# Altium footprint library Minh_Lib.PcbLib: 141 footprints (part 3 of 9)
Each footprint in its own frame and in the unit in brackets; x right, y up, seen from the top. Pads: shape width x height; smd on the part's side, far side on the other; paste and mask are expansions set on the pad; w line width, h text height; cw(c..) or ccw(c..) is an arc to the next point about the centre after c.
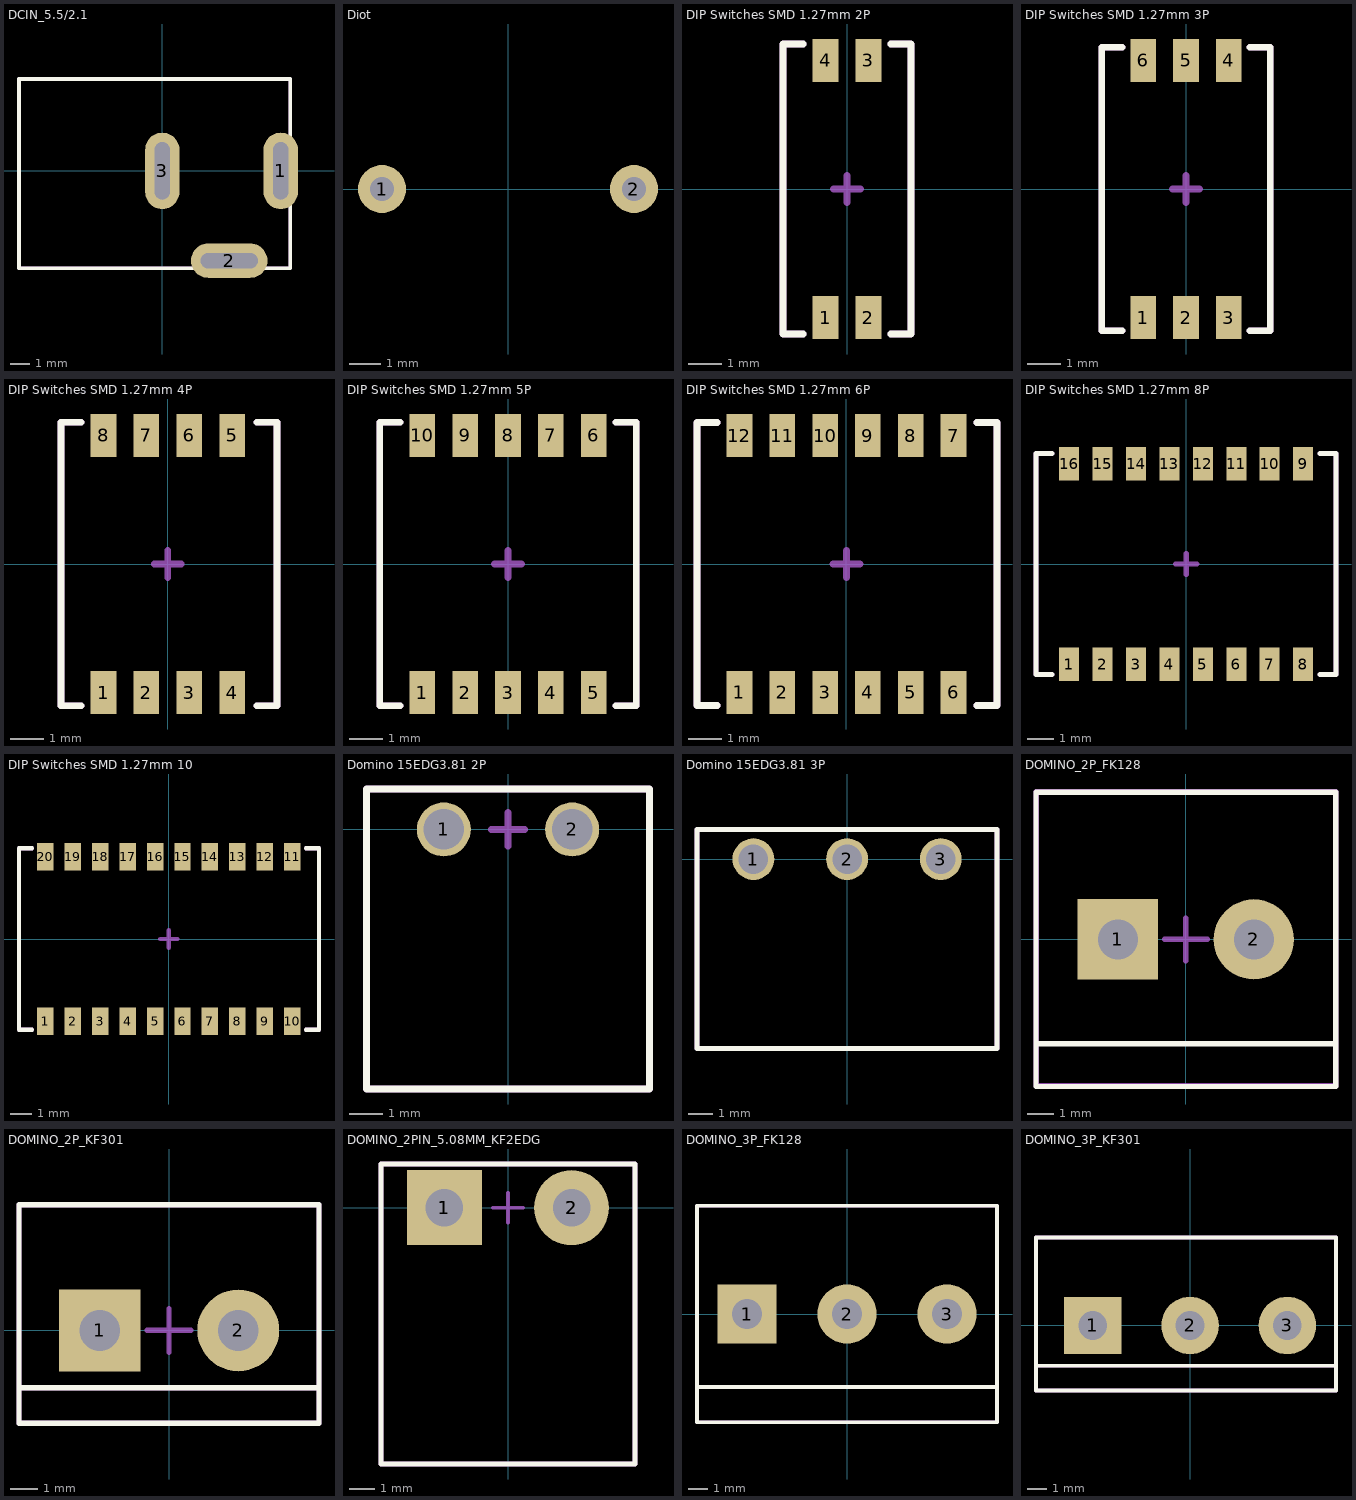
[diagram p2: the footprints below, top view; thin cyan lines are the x and y axes]

## DCIN_5.5/2.1 [mm] "DCInput _ 5.5/2.1"
pads (3):
  oval 1.8x4 hole 0.8 slot 3 at 90 deg: 1(6.2,0) 3(0,0)
  oval 4x1.8 hole 0.8 slot 3 at 0 deg: 2(3.5,-4.7)
Top Overlay:
  lines w0.2: -7.5,-5.1 6.7,-5.1 6.7,4.8 -7.5,4.8 -7.5,-5.1
Mechanical 13:
  lines w0.2: -7.5,-5.1 6.7,-5.1 6.7,4.8 -7.5,4.8 -7.5,-5.1
  text "+" at 7.5,-0.6 h1.2
  text "'.Designator'" at -7.3,-1 h1.2
Mechanical 15:
  lines w0.2: -0.6,0 0,0 ; 0,-0.6 0,0 ; 0,0.6 0,0 ; 0.6,0 0,0
3D body "User Library-dc range - dc connector[4840_2201].step": height 11.01, standoff -3.49, extent -7.303,-4.905 6.524,4.6

## Diot [mil]
pads (2):
  round 60 hole 30: 1(-157.48,0) 2(157.48,0)

## DIP Switches SMD 1.27mm 2P [mm] "Wurth Elektronik - 416131160802"
pads (4):
  rect 0.76x1.27 smd: 1(-0.635,-3.81) 2(0.635,-3.81) 3(0.635,3.81) 4(-0.635,3.81)
Top Overlay:
  lines w0.2: -1.3,-4.3 -1.9,-4.3 -1.9,4.3 -1.3,4.3 ; 1.3,-4.3 1.9,-4.3 1.9,4.3 1.3,4.3
Mechanical 13:
  lines w0.2: -1.3,-4.3 -1.9,-4.3 -1.9,4.3 -1.3,4.3 ; 1.3,-4.3 1.9,-4.3 1.9,4.3 1.3,4.3
  text "'.Designator'" at -1.7,-2.7 h1
Mechanical 15:
  lines w0.2: -0.4,0 0,0 ; 0,-0.4 0,0 ; 0,0.4 0,0 ; 0.4,0 0,0
3D body "User Library-416131160802.step": height 2.6, standoff 0, extent -1.855,-4.22 1.855,4.22

## DIP Switches SMD 1.27mm 3P [mm] "Wurth Elektronik - 416131160803"
pads (6):
  rect 0.76x1.27 smd: 1(-1.27,-3.81) 2(0,-3.81) 3(1.27,-3.81) 4(1.27,3.81) 5(0,3.81) 6(-1.27,3.81)
Top Overlay:
  lines w0.2: -1.9,-4.2 -2.5,-4.2 -2.5,4.2 -1.9,4.2 ; 1.9,-4.2 2.5,-4.2 2.5,4.2 1.9,4.2
Mechanical 13:
  lines w0.2: -1.9,-4.2 -2.5,-4.2 -2.5,4.2 -1.9,4.2 ; 1.9,-4.2 2.5,-4.2 2.5,4.2 1.9,4.2
  text "'.Designator'" at -1.9,-2.7 h1
Mechanical 15:
  lines w0.2: -0.4,0 0,0 ; 0,-0.4 0,0 ; 0,0.4 0,0 ; 0.4,0 0,0
3D body "User Library-416131160803.step": height 2.6, standoff 0, extent -2.49,-4.22 2.49,4.22

## DIP Switches SMD 1.27mm 4P [mm] "Wurth Elektronik - 416131160804"
pads (8):
  rect 0.76x1.27 smd: 1(-1.905,-3.81) 2(-0.635,-3.81) 3(0.635,-3.81) 4(1.905,-3.81) 5(1.905,3.81) 6(0.635,3.81) 7(-0.635,3.81) 8(-1.905,3.81)
Top Overlay:
  lines w0.2: -2.565,-4.2 -3.165,-4.2 -3.165,4.2 -2.565,4.2 ; 2.635,-4.2 3.235,-4.2 3.235,4.2 2.635,4.2
Mechanical 13:
  lines w0.2: -2.565,-4.2 -3.165,-4.2 -3.165,4.2 -2.565,4.2 ; 2.635,-4.2 3.235,-4.2 3.235,4.2 2.635,4.2
  text "'.Designator'" at -2.54,-2.54 h1
Mechanical 15:
  lines w0.2: -0.4,0 0,0 ; 0,-0.4 0,0 ; 0,0.4 0,0 ; 0.4,0 0,0
3D body "User Library-416131160804.step": height 2.6, standoff 0, extent -3.125,-4.22 3.125,4.22

## DIP Switches SMD 1.27mm 5P [mm] "Wurth Elektronik - 416131160805"
pads (10):
  rect 0.76x1.27 smd: 1(-2.54,-3.81) 2(-1.27,-3.81) 3(0,-3.81) 4(1.27,-3.81) 5(2.54,-3.81) 6(2.54,3.81) 7(1.27,3.81) 8(0,3.81) 9(-1.27,3.81) 10(-2.54,3.81)
Top Overlay:
  lines w0.2: -3.2,-4.2 -3.8,-4.2 -3.8,4.2 -3.2,4.2 ; 3.2,-4.2 3.8,-4.2 3.8,4.2 3.2,4.2
Mechanical 13:
  lines w0.2: -3.2,-4.2 -3.8,-4.2 -3.8,4.2 -3.2,4.2 ; 3.2,-4.2 3.8,-4.2 3.8,4.2 3.2,4.2
  text "'.Designator'" at -3,-3 h1
Mechanical 15:
  lines w0.2: -0.4,0 0,0 ; 0,-0.4 0,0 ; 0,0.4 0,0 ; 0.4,0 0,0
3D body "User Library-416131160805.step": height 2.6, standoff 0, extent -3.76,-4.22 3.76,4.22

## DIP Switches SMD 1.27mm 6P [mm] "Wurth Elektronik - 416131160806"
pads (12):
  rect 0.76x1.27 smd: 1(-3.175,-3.81) 2(-1.905,-3.81) 3(-0.635,-3.81) 4(0.635,-3.81) 5(1.905,-3.81) 6(3.175,-3.81) 7(3.175,3.81) 8(1.905,3.81) 9(0.635,3.81) 10(-0.635,3.81) 11(-1.905,3.81) 12(-3.175,3.81)
Top Overlay:
  lines w0.2: -3.835,-4.2 -4.435,-4.2 -4.435,4.2 -3.835,4.2 ; 3.865,-4.2 4.465,-4.2 4.465,4.2 3.865,4.2
Mechanical 13:
  lines w0.2: -3.835,-4.2 -4.435,-4.2 -4.435,4.2 -3.835,4.2 ; 3.865,-4.2 4.465,-4.2 4.465,4.2 3.865,4.2
  text "'.Designator'" at -3.81,-2.54 h1
Mechanical 15:
  lines w0.2: -0.4,0 0,0 ; 0,-0.4 0,0 ; 0,0.4 0,0 ; 0.4,0 0,0
3D body "User Library-416131160806.step": height 2.6, standoff 0, extent -4.395,-4.22 4.395,4.22

## DIP Switches SMD 1.27mm 8P [mm] "Wurth Elektronik - 416131160808"
pads (16):
  rect 0.76x1.27 smd: 1(-4.445,-3.81) 2(-3.175,-3.81) 3(-1.905,-3.81) 4(-0.635,-3.81) 5(0.635,-3.81) 6(1.905,-3.81) 7(3.175,-3.81) 8(4.445,-3.81) 9(4.445,3.81) 10(3.175,3.81) 11(1.905,3.81) 12(0.635,3.81) 13(-0.635,3.81) 14(-1.905,3.81) 15(-3.175,3.81) 16(-4.445,3.81)
Top Overlay:
  lines w0.2: -5.105,-4.2 -5.705,-4.2 -5.705,4.2 -5.105,4.2 ; 5.095,-4.2 5.695,-4.2 5.695,4.2 5.095,4.2
Mechanical 13:
  lines w0.2: -5.105,-4.2 -5.705,-4.2 -5.705,4.2 -5.105,4.2 ; 5.095,-4.2 5.695,-4.2 5.695,4.2 5.095,4.2
  text "'.Designator'" at -4.445,-3.175 h1
Mechanical 15:
  lines w0.2: -0.4,0 0,0 ; 0,-0.4 0,0 ; 0,0.4 0,0 ; 0.4,0 0,0
3D body "User Library-416131160808.step": height 2.6, standoff 0, extent -5.615,-4.22 5.715,4.22

## DIP Switches SMD 1.27mm 10 [mm] "Wurth Elektronik - 416131160810"
pads (20):
  rect 0.76x1.27 smd: 1(-5.715,-3.81) 2(-4.445,-3.81) 3(-3.175,-3.81) 4(-1.905,-3.81) 5(-0.635,-3.81) 6(0.635,-3.81) 7(1.905,-3.81) 8(3.175,-3.81) 9(4.445,-3.81) 10(5.715,-3.81) 11(5.715,3.81) 12(4.445,3.81) 13(3.175,3.81) 14(1.905,3.81) 15(0.635,3.81) 16(-0.635,3.81) 17(-1.905,3.81) 18(-3.175,3.81) 19(-4.445,3.81) 20(-5.715,3.81)
Top Overlay:
  lines w0.2: -6.34,-4.2 -6.94,-4.2 -6.94,4.2 -6.34,4.2 ; 6.36,-4.2 6.96,-4.2 6.96,4.2 6.36,4.2
Mechanical 13:
  lines w0.2: -6.34,-4.2 -6.94,-4.2 -6.94,4.2 -6.34,4.2 ; 6.36,-4.2 6.96,-4.2 6.96,4.2 6.36,4.2
  text "'.Designator'" at -5.715,-2.54 h1
Mechanical 15:
  lines w0.2: -0.4,0 0,0 ; 0,-0.4 0,0 ; 0,0.4 0,0 ; 0.4,0 0,0
3D body "User Library-416131160810.step": height 2.6, standoff 0, extent -6.905,-4.22 6.965,4.22

## Domino 15EDG3.81 2P [mm]
pads (2):
  round 1.6 hole 1.2: 1(-1.905,0) 2(1.905,0)
Top Overlay:
  lines w0.2: -4.2,-7.7 -4.2,1.2 4.2,1.2 4.2,-7.7 -4.2,-7.7
Mechanical 13:
  lines w0.2: -4.2,-7.7 -4.2,1.2 4.2,1.2 4.2,-7.7 -4.2,-7.7
  text "'.Designator'" at -3.7,-6.8 h1.2
Mechanical 15:
  lines w0.2: -0.5,0 0,0 ; 0,-0.5 0,0 ; 0,0.5 0,0 ; 0.5,0 0,0
3D body "User Library-15EDG[K-RC]-3_81-02 (combin).STEP": height 7.47, standoff -3.53, extent -4.21,-17.175 4.2,1.175

## Domino 15EDG3.81 3P [mm]
pads (3):
  round 1.7 hole 1.2: 1(-3.81,0) 2(0,0) 3(3.81,0)
Top Overlay:
  lines w0.2: -6.105,-7.7 -6.105,1.2 6.1,1.2 6.1,-7.7 -6.105,-7.7
Mechanical 13:
  lines w0.2: -6.105,-7.7 -6.105,1.2 6.1,1.2 6.1,-7.7 -6.105,-7.7
  text "'.Designator'" at -5.605,-6.8 h1.2
Mechanical 15:
  lines w0.2: -0.5,0 0,0 ; 0,-0.5 0,0 ; 0,0.5 0,0 ; 0.5,0 0,0
3D body "User Library-15EDG[K-RC]-3_81-03 (combin).STEP": height 7.37, standoff -3.63, extent -6.12,-17.15 6.1,1.2

## DOMINO_2P_FK128 [mm] "DOMINO 2P FK128"
pads (2):
  rect 3x3 hole 1.5: 1(-2.54,0)
  round 3 hole 1.5: 2(2.54,0)
Top Overlay:
  lines w0.2: -5.5,-3.9 5.5,-3.9 ; -5.6,-5.5 5.6,-5.5 5.6,5.5 -5.6,5.5 -5.6,-5.5
Mechanical 13:
  lines w0.2: -5.589,-5.473 5.611,-5.473 5.611,5.527 -5.589,5.527 -5.589,-5.473
  text "'.Designator'" at -5.4,-3.3 h1.2
Mechanical 15:
  lines w0.2: -0.8,0 0,0 ; 0,-0.8 0,0 ; 0,0.8 0,0 ; 0.8,0 0,0
3D body "KF128-5.08-2P.STEP": height 14.16, standoff -3.79, extent -5.559,-5.15 5.201,5.15

## DOMINO_2P_KF301 [mm] "DOMINO 2P KF301"
pads (2):
  rect 3x3 hole 1.5: 1(-2.54,0)
  round 3 hole 1.5: 2(2.54,0)
Top Overlay:
  lines w0.2: -5.5,-2.1 5.4,-2.1 ; -5.5,-3.4 5.5,-3.4 5.5,4.6 -5.5,4.6 -5.5,-3.4
Mechanical 13:
  lines w0.2: -5.5,-2.1 5.4,-2.1 ; -5.5,-3.4 5.5,-3.4 5.5,4.6 -5.5,4.6 -5.5,-3.4
  text "'.Designator'" at -5.4,-0.3 h1.2
Mechanical 15:
  lines w0.2: -0.8,0 0,0 ; 0,-0.8 0,0 ; 0,0.8 0,0 ; 0.8,0 0,0
3D body "User Library-Terminal-Screw-3A-2way.step": height 10, standoff -3, extent -5.3,-3.2 5.3,4.4

## DOMINO_2PIN_5.08MM_KF2EDG [mm] "KF2EDG"
pads (4):
  rect 3x3 hole 1.5: 1(-2.54,0) 1(-2.54,0)
  round 3 hole 1.5: 2(2.54,0) 2(2.54,0)
Top Overlay:
  lines w0.2: -5.08,-10.25 -5.08,1.75 5.08,1.75 5.08,-10.25 -5.08,-10.25
Mechanical 13:
  lines w0.2: -5.08,-10.25 -5.08,1.75 5.08,1.75 5.08,-10.25 -5.08,-10.25
  text "'.Designator'" at -4.98,-4.58 h1.2
Mechanical 15:
  lines w0.15: -0.598,-0.002 0.002,-0.002 ; 0,-0.6 0,0 0,0.6 ; 0,-0.002 0.6,-0.002
3D body "Plug 200mil.STEP": height 14.75, standoff -0.25, extent -5.18,-18.92 4.98,-0.72
3D body "Header 200mil.STEP": height 8.3, standoff -3.9, extent -5.06,-9.95 5.1,2.05

## DOMINO_3P_FK128 [mm] "DOMINO 3P FK128"
pads (3):
  rect 3x3 hole 1.5: 1(-5.08,0)
  round 3 hole 1.5: 2(0,0) 3(5.08,0)
Top Overlay:
  lines w0.2: -7.6,-3.7 7.6,-3.7 ; -7.62,-5.5 7.62,-5.5 7.62,5.5 -7.62,5.5 -7.62,-5.5
Mechanical 13:
  lines w0.2: -7.62,-5.5 7.62,-5.5 7.62,5.5 -7.62,5.5 -7.62,-5.5
  text "'.Designator'" at -7.3,-3.7 h1.2
Mechanical 15:
  lines w0.2: -0.8,0 0,0 ; 0,-0.8 0,0 ; 0,0.8 0,0 ; 0.8,0 0,0
3D body "KF128-5.08_3P.STEP": height 14.16, standoff -3.79, extent -7.67,-5.03 8.17,5.27

## DOMINO_3P_KF301 [mm] "DOMINO 3P KF301"
pads (3):
  rect 3x3 hole 1.5: 1(-5.08,0)
  round 3 hole 1.5: 2(0,0) 3(5.08,0)
Top Overlay:
  lines w0.2: -8.04,-2.1 7.56,-2.1 ; -8.04,-3.4 7.62,-3.4 7.62,4.6 -8.04,4.6 -8.04,-3.4
Mechanical 13:
  lines w0.2: -8.04,-2.1 7.56,-2.1 ; -8.04,-3.4 7.62,-3.4 7.62,4.6 -8.04,4.6 -8.04,-3.4
  text "'.Designator'" at -7.52,-0.77 h1.2
Mechanical 15:
  lines w0.2: -0.8,0 0,0 ; 0,-0.8 0,0 ; 0,0.8 0,0 ; 0.8,0 0,0
3D body "User Library-Terminal-Screw-3A-3way.step": height 10, standoff -3, extent -8,-3.1 7.6,4.5